# Altium footprint library ParsaLibrary.PcbLib: 526 footprints (part 10 of 33)
Each footprint in its own frame and in the unit in brackets; x right, y up, seen from the top. Pads: shape width x height; smd on the part's side, far side on the other; paste and mask are expansions set on the pad; w line width, h text height; cw(c..) or ccw(c..) is an arc to the next point about the centre after c.
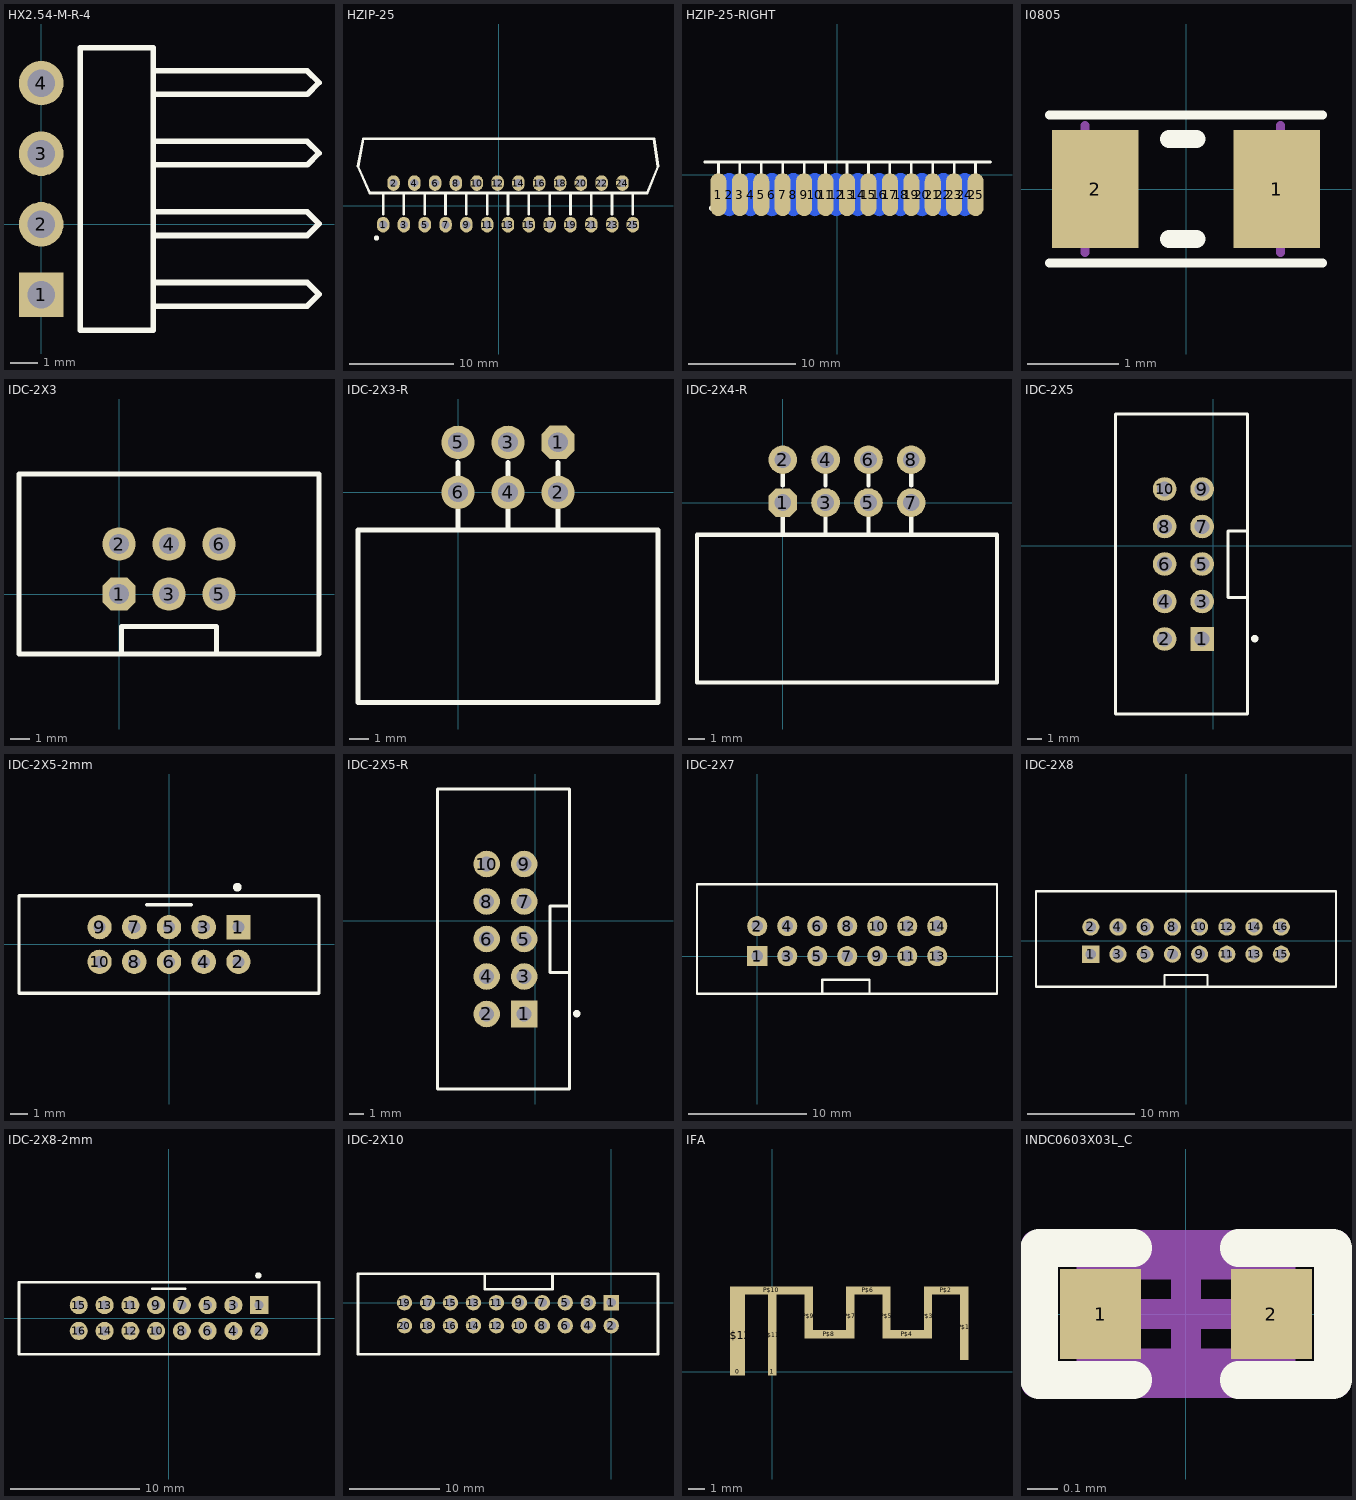
[diagram p9: the footprints below, top view; thin cyan lines are the x and y axes]

## HX2.54-M-R-4 [mm]
pads (4):
  rect 1.6x1.6 hole 1: 1(0,-2.54)
  round 1.6 hole 1: 2(0,0) 3(0,2.54) 4(0,5.08)
Top Overlay:
  lines w0.2: 4.04,-2.943 9.577,-2.943 10,-2.52 9.577,-2.097 4.04,-2.097 ; 4.04,-0.403 9.577,-0.403 10,0.02 9.577,0.443 4.04,0.443 ; 4.04,2.137 9.577,2.137 10,2.56 9.577,2.983 4.04,2.983 ; 4.04,4.677 9.577,4.677 10,5.1 9.577,5.523 4.04,5.523 ; 1.4,-3.81 2.54,-3.81 4.04,-3.81 4.04,6.35 2.54,6.35 1.4,6.35 1.4,-3.81
3D body "User Library-Header90-1.SLDPRT": height 2.67, standoff -2.87, extent -0.29,3.85 10.07,6.39
3D body "User Library-Header90-1.SLDPRT": height 2.67, standoff -2.87, extent -0.29,1.31 10.07,3.85
3D body "User Library-Header90-1.SLDPRT": height 2.67, standoff -2.87, extent -0.29,-1.23 10.07,1.31
3D body "User Library-Header90-1.SLDPRT": height 2.67, standoff -2.87, extent -0.29,-3.77 10.07,-1.23

## HZIP-25 [mm]
pads (25):
  oval 1.2x1.5 hole 0.8: 1(-11.096,-1.841) 2(-10.096,2.159) 3(-9.096,-1.841) 4(-8.096,2.159) 5(-7.096,-1.841) 6(-6.096,2.159) 7(-5.096,-1.841) 8(-4.096,2.159) 9(-3.096,-1.841) 10(-2.096,2.159) 11(-1.096,-1.841) 12(-0.096,2.159) 13(0.904,-1.841) 14(1.904,2.159) 15(2.904,-1.841) 16(3.904,2.159) 17(4.904,-1.841) 18(5.904,2.159) 19(6.906,-1.841) 20(7.906,2.159) 21(8.906,-1.841) 22(9.906,2.159) 23(10.906,-1.841) 24(11.906,2.159) 25(12.906,-1.841)
Top Overlay:
  circle w0.254: c-11.731,-3.111 r0.127
  lines w0.254: -11.096,-0.825 -11.096,1.08 ; -9.096,-0.825 -9.096,1.08 ; -7.096,-0.825 -7.096,1.08 ; -5.096,-0.825 -5.096,1.08 ; -3.096,-0.825 -3.096,1.08 ; -1.096,-0.825 -1.096,1.08 ; 0.904,-0.825 0.904,1.08 ; 2.904,-0.825 2.904,1.08 ; 4.904,-0.825 4.904,1.08 ; 6.906,-0.825 6.906,1.08 ; 8.906,-0.825 8.906,1.08 ; 10.906,-0.825 10.906,1.08 ; 12.906,-0.825 12.906,1.08 ; -13.509,3.747 -12.366,1.207 14.304,1.207 15.32,3.747 14.939,6.414 -13.001,6.414 -13.509,3.747
3D body "User Library-HZIP25-1_00F.step": height 19.73, standoff -2.77, extent -13.511,-2.06 15.289,6.35

## HZIP-25-RIGHT [mm]
pads (25):
  oval 1.5x4 smd: 1(-11.096,-1.841) 3(-9.096,-1.841) 5(-7.096,-1.841) 7(-5.096,-1.841) 9(-3.096,-1.841) 11(-1.096,-1.841) 13(0.904,-1.841) 15(2.904,-1.841) 17(4.904,-1.841) 19(6.906,-1.841) 21(8.906,-1.841) 23(10.906,-1.841) 25(12.906,-1.841)
  oval 1.5x4 smd far side: 2(-10.096,-1.841) 4(-8.096,-1.841) 6(-6.096,-1.841) 8(-4.096,-1.841) 10(-2.096,-1.841) 12(-0.096,-1.841) 14(1.904,-1.841) 16(3.904,-1.841) 18(5.904,-1.841) 20(7.906,-1.841) 22(9.906,-1.841) 24(11.906,-1.841)
Top Overlay:
  circle w0.254: c-11.731,-3.111 r0.127
  lines w0.254: -12.366,1.207 14.304,1.207 ; -11.096,-0.825 -11.096,1.08 ; -9.096,-0.825 -9.096,1.08 ; -7.096,-0.825 -7.096,1.08 ; -5.096,-0.825 -5.096,1.08 ; -3.096,-0.825 -3.096,1.08 ; -1.096,-0.825 -1.096,1.08 ; 0.904,-0.825 0.904,1.08 ; 2.904,-0.825 2.904,1.08 ; 4.904,-0.825 4.904,1.08 ; 6.906,-0.825 6.906,1.08 ; 8.906,-0.825 8.906,1.08 ; 10.906,-0.825 10.906,1.08 ; 12.906,-0.825 12.906,1.08
3D body "User Library-HZIP25-1_00F.step": height 2.16, standoff -6.25, extent -13.638,-1.055 15.162,21.445

## I0805 [mm]
pads (2):
  rect 0.95x1.3 smd: 1(1,0) 2(-1,0)
Top Overlay:
  lines w0.1: -1.5,-0.813 1.5,-0.813 ; -1.5,0.813 1.5,0.813
  lines w0.2: -0.188,-0.55 0.112,-0.55 ; -0.188,0.55 0.112,0.55
Mechanical 13:
  lines w0.1: -1.113,-0.7 -1.113,0.7 ; 1.037,-0.7 1.037,0.7
3D body "User Library-FB_2012.STEP": height 0.63, standoff -0.63, extent -1,-0.45 1,0.4

## IDC-2X3 [mm]
pads (6):
  oct 1.7x1.7 hole 1: 1(0,0)
  round 1.7 hole 1: 2(0,2.54) 3(2.54,0) 4(2.54,2.54) 5(5.08,0) 6(5.08,2.54)
Top Overlay:
  lines w0.254: 0.127,-3.048 0.127,-1.651 4.953,-1.651 4.953,-3.048 ; -5.08,-3.048 -5.08,6.096 10.16,6.096 10.16,-3.048 -5.08,-3.048
3D body "65714.stp": height 9.03, standoff -3.08, extent -5.1,-3.028 10.18,6.072

## IDC-2X3-R [mm]
pads (6):
  oct 1.7x1.7 hole 1: 1(5.08,2.54)
  round 1.7 hole 1: 2(5.08,0) 3(2.54,2.54) 4(2.54,0) 5(0,2.54) 6(0,0)
Top Overlay:
  lines w0.254: 0,-1.905 0,-0.889 ; 0,0.889 0,1.524 ; 2.54,-1.905 2.54,-0.889 ; 2.54,0.889 2.54,1.524 ; 5.08,-1.905 5.08,-0.889 ; 5.08,0.889 5.08,1.524 ; -5.08,-10.668 10.16,-10.668 10.16,-1.905 -5.08,-1.905 -5.08,-10.668
3D body "65715.stp": height 9.43, standoff -2.4, extent -5.1,-10.648 10.18,2.902

## IDC-2X4-R [mm]
pads (8):
  oct 1.7x1.7 hole 1: 1(0,0)
  round 1.7 hole 1: 2(0,2.54) 3(2.54,0) 4(2.54,2.54) 5(5.08,0) 6(5.08,2.54) 7(7.62,0) 8(7.62,2.54)
Top Overlay:
  lines w0.254: 0,-1.905 0,-0.889 ; 0,1.016 0,1.651 ; 2.54,-1.905 2.54,-0.889 ; 2.54,1.016 2.54,1.651 ; 5.08,-1.905 5.08,-0.889 ; 5.08,1.016 5.08,1.651 ; 7.62,-1.905 7.62,-0.889 ; 7.62,1.016 7.62,1.651 ; -5.08,-10.668 -5.08,-1.905 12.7,-1.905 12.7,-10.668 -5.08,-10.668
3D body "65719.stp": height 9.43, standoff -2.4, extent -5.1,-10.648 12.72,2.902

## IDC-2X5 [mm]
pads (10):
  rect 1.6x1.6 hole 1: 1(-0.762,-6.325)
  round 1.6 hole 1: 2(-3.302,-6.325) 3(-0.762,-3.785) 4(-3.302,-3.785) 5(-0.762,-1.245) 6(-3.302,-1.245) 7(-0.762,1.295) 8(-3.302,1.295) 9(-0.762,3.835) 10(-3.302,3.835)
Top Overlay:
  circle w0.25: c2.8,-6.3 r0.125
  lines w0.2: 2.3,-3.5 1,-3.5 1,1 2.3,1 ; -6.632,-11.405 2.3,-11.405 2.3,8.915 -6.632,8.915 -6.632,-11.405
Mechanical 13:
  lines w0.1: -6.632,-11.405 -6.632,8.915 2.3,8.915 2.3,-11.405 -6.632,-11.405
3D body "header_awhw10g-0202-t.STEP": height 9, standoff -3.5, extent -6.514,-11.405 2.286,8.915

## IDC-2X5-2mm [mm]
pads (10):
  rect 1.4x1.4 hole 0.7: 1(4,1)
  round 1.4 hole 0.7: 2(4,-1) 3(2,1) 4(2,-1) 5(0,1) 6(0,-1) 7(-2,1) 8(-2,-1) 9(-4,1) 10(-4,-1)
Top Overlay:
  circle w0.25: c3.937,3.302 r0.125
  lines w0.2: -1.27,2.286 1.27,2.286 ; -8.636,-2.794 -8.636,2.794 8.636,2.794 8.636,-2.794 -8.636,-2.794
3D body "62501021621.stp": height 5.65, standoff -2.45, extent -8.6,-2.75 8.6,2.75

## IDC-2X5-R [mm]
pads (10):
  rect 1.8x1.8 hole 1: 1(-0.762,-6.325)
  round 1.8 hole 1: 2(-3.302,-6.325) 3(-0.762,-3.785) 4(-3.302,-3.785) 5(-0.762,-1.245) 6(-3.302,-1.245) 7(-0.762,1.295) 8(-3.302,1.295) 9(-0.762,3.835) 10(-3.302,3.835)
Top Overlay:
  circle w0.25: c2.8,-6.3 r0.125
  lines w0.2: 2.3,-3.5 1,-3.5 1,1 2.3,1 ; -6.632,-11.405 -6.632,8.915 2.3,8.915 2.3,-11.405 -6.632,-11.405
Mechanical 13:
  lines w0.1: -6.632,-11.405 2.3,-11.405 2.3,8.915 -6.632,8.915 -6.632,-11.405

## IDC-2X7 [mm]
pads (14):
  rect 1.7x1.7 hole 1: 1(0,0)
  round 1.7 hole 1: 2(0,2.54) 3(2.54,0) 4(2.54,2.54) 5(5.08,0) 6(5.08,2.54) 7(7.62,0) 8(7.62,2.54) 9(10.16,0) 10(10.16,2.54) 11(12.7,0) 12(12.7,2.54) 13(15.24,0) 14(15.24,2.54)
Top Overlay:
  lines w0.2: 5.5,-3.2 5.5,-2 9.5,-2 9.5,-3.2 ; -5.1,-3.2 -5.1,6.1 20.3,6.1 20.3,-3.2 -5.1,-3.2
3D body "User Library-IDC-14MS.STEP": height 9.25, standoff -3.45, extent -5.1,-3.175 20.3,6.175

## IDC-2X8 [mm]
pads (16):
  rect 1.6x1.6 hole 1: 1(-8.89,-1.27)
  round 1.6 hole 1: 2(-8.89,1.27) 3(-6.35,-1.27) 4(-6.35,1.27) 5(-3.81,-1.27) 6(-3.81,1.27) 7(-1.27,-1.27) 8(-1.27,1.27) 9(1.27,-1.27) 10(1.27,1.27) 11(3.81,-1.27) 12(3.81,1.27) 13(6.35,-1.27) 14(6.35,1.27) 15(8.89,-1.27) 16(8.89,1.27)
Top Overlay:
  lines w0.2: -2,-4.3 -2,-3.2 2,-3.2 2,-4.3 ; -14,-4.3 13.991,-4.3 14,4.6 -14,4.6 -14,-4.3
3D body "User Library-IDC Socket Male 16pin Straight THT Goldplated 2_54mm.step": height 9.13, standoff -3.27, extent -13.96,-4.25 13.96,4.6

## IDC-2X8-2mm [mm]
pads (16):
  rect 1.4x1.4 hole 0.7: 1(7,1)
  round 1.4 hole 0.7: 2(7,-1) 3(5,1) 4(5,-1) 5(3,1) 6(3,-1) 7(1,1) 8(1,-1) 9(-1,1) 10(-1,-1) 11(-3,1) 12(-3,-1) 13(-5,1) 14(-5,-1) 15(-7,1) 16(-7,-1)
Top Overlay:
  circle w0.25: c6.937,3.302 r0.125
  lines w0.2: -1.293,2.286 1.247,2.286 ; -11.636,-2.794 -11.636,2.794 11.636,2.794 11.636,-2.794 -11.636,-2.794
3D body "62501621621.x_t": height 5.65, standoff -2.45, extent -11.6,-2.75 11.6,2.75

## IDC-2X10 [mm]
pads (20):
  rect 1.7x1.7 hole 1: 1(0,0)
  round 1.7 hole 1: 2(0,-2.54) 3(-2.54,0) 4(-2.54,-2.54) 5(-5.08,0) 6(-5.08,-2.54) 7(-7.62,0) 8(-7.62,-2.54) 9(-10.16,0) 10(-10.16,-2.54) 11(-12.7,0) 12(-12.7,-2.54) 13(-15.24,0) 14(-15.24,-2.54) 15(-17.78,0) 16(-17.78,-2.54) 17(-20.32,0) 18(-20.32,-2.54) 19(-22.86,0) 20(-22.86,-2.54)
Top Overlay:
  lines w0.3: -14,3.2 -14,1.5 -6.5,1.5 -6.5,3.2 ; -28,-5.7 5.17,-5.7 5.17,3.2 -28,3.2 -28,-5.7
3D body "DS1013-20S (IDC-20MS CONNFLY).stp": height 9, standoff -3.6, extent -28.03,-5.67 5.17,3.23

## IFA [mm]
pads (14):
  rect 0.9x0.5 smd: 0(-2.1,0)
  rect 0.5x0.5 smd: 1(0,0)
  rect 0.5x3.94 smd: P$1(11.6,2.68)
  rect 2.7x0.5 smd: P$2(10.5,4.9) P$6(5.8,4.9)
  rect 0.5x2.64 smd: P$3(9.4,3.33) P$5(6.9,3.33) P$7(4.7,3.33) P$9(2.2,3.33)
  rect 2x0.5 smd: P$4(8.15,2.26) P$8(3.45,2.26)
  rect 5x0.5 smd: P$10(-0.05,4.9)
  rect 0.5x4.9 smd: P$11(0,2.2)
  rect 0.9x4.9 smd: P$12(-2.1,2.2)

## INDC0603X03L_C [mm]
pads (2):
  rect 0.27x0.3 smd: 1(-0.285,0) 2(0.285,0)
Top Overlay:
  lines w0.125: -0.175,-0.22 -0.49,-0.22 -0.49,0.22 -0.175,0.22 ; 0.175,-0.22 0.49,-0.22 0.49,0.22 0.175,0.22
Mechanical 7:
  lines w0.1: -0.315,-0.165 -0.315,0.165 0.315,0.165 0.315,-0.165 -0.315,-0.165
  text ".Designator" at -0.306,0.268 h0.3
Mechanical 15:
  lines w0.1: -0.165,0 0.165,0 ; 0,-0.165 0,0.165 ; -0.5,-0.23 -0.5,0.23 0.5,0.23 0.5,-0.23 -0.5,-0.23
3D body "User Library-smt_inductor-0201.step": height 0.26, standoff -0.01, extent -0.31,-0.16 0.31,0.16